# Altium integrated library ALTIUM-WR-TBL_RISING_CLAMP_SYSTEM-rev18b.IntLib: 432 symbols (part 1 of 2) (continued)
## 691244500010 (continued)

## 691244510004
designator J?
Serie 2445 - 5.08 mm Horizontal Entry Modular with Rising Cage Clamp WR-TBL, 4 pin; Part Number: 691244510004; Pin Number: 4; Pitch: 5.08 mm; ComponentLink1Description: Manufacturer; ComponentLink1URL: http://www.we-online.de; ComponentLink2Description: Datasheet; ComponentLink2URL: http://katalog.we-online.de/em/datasheet/6912445100xx.pdf; Published Date: June 2018; Publisher: Wurth Elektronik; Operating Temperature: -30 to 120 degC; Mounting Technology: THT; Packaging: Box
footprint 691244510004
pins: 1, 2, 3, 4

## 691244510005
designator J?
Serie 2445 - 5.08 mm Horizontal Entry Modular with Rising Cage Clamp WR-TBL, 5 pin; Part Number: 691244510005; Pin Number: 5; Pitch: 5.08 mm; ComponentLink1Description: Manufacturer; ComponentLink1URL: http://www.we-online.de; ComponentLink2Description: Datasheet; ComponentLink2URL: http://katalog.we-online.de/em/datasheet/6912445100xx.pdf; Published Date: June 2018; Publisher: Wurth Elektronik; Operating Temperature: -30 to 120 degC; Mounting Technology: THT; Packaging: Box
footprint 691244510005
pins: 1, 2, 3, 4, 5

## 691244510006
designator J?
Serie 2445 - 5.08 mm Horizontal Entry Modular with Rising Cage Clamp WR-TBL, 6 pin; Part Number: 691244510006; Pin Number: 6; Pitch: 5.08 mm; ComponentLink1Description: Manufacturer; ComponentLink1URL: http://www.we-online.de; ComponentLink2Description: Datasheet; ComponentLink2URL: http://katalog.we-online.de/em/datasheet/6912445100xx.pdf; Published Date: June 2018; Publisher: Wurth Elektronik; Operating Temperature: -30 to 120 degC; Mounting Technology: THT; Packaging: Box
footprint 691244510006
pins: 1, 2, 3, 4, 5, 6

## 691244510007
designator J?
Serie 2445 - 5.08 mm Horizontal Entry Modular with Rising Cage Clamp WR-TBL, 7 pin; Part Number: 691244510007; Pin Number: 7; Pitch: 5.08 mm; ComponentLink1Description: Manufacturer; ComponentLink1URL: http://www.we-online.de; ComponentLink2Description: Datasheet; ComponentLink2URL: http://katalog.we-online.de/em/datasheet/6912445100xx.pdf; Published Date: June 2018; Publisher: Wurth Elektronik; Operating Temperature: -30 to 120 degC; Mounting Technology: THT; Packaging: Box
footprint 691244510007
pins: 1, 2, 3, 4, 5, 6, 7

## 691244510008
designator J?
Serie 2445 - 5.08 mm Horizontal Entry Modular with Rising Cage Clamp WR-TBL, 8 pin; Part Number: 691244510008; Pin Number: 8; Pitch: 5.08 mm; ComponentLink1Description: Manufacturer; ComponentLink1URL: http://www.we-online.de; ComponentLink2Description: Datasheet; ComponentLink2URL: http://katalog.we-online.de/em/datasheet/6912445100xx.pdf; Published Date: June 2018; Publisher: Wurth Elektronik; Operating Temperature: -30 to 120 degC; Mounting Technology: THT; Packaging: Box
footprint 691244510008
pins: 1, 2, 3, 4, 5, 6, 7, 8

## 691244510009
designator J?
Serie 2445 - 5.08 mm Horizontal Entry Modular with Rising Cage Clamp WR-TBL, 9 pin; Part Number: 691244510009; Pin Number: 9; Pitch: 5.08 mm; ComponentLink1Description: Manufacturer; ComponentLink1URL: http://www.we-online.de; ComponentLink2Description: Datasheet; ComponentLink2URL: http://katalog.we-online.de/em/datasheet/6912445100xx.pdf; Published Date: June 2018; Publisher: Wurth Elektronik; Operating Temperature: -30 to 120 degC; Mounting Technology: THT; Packaging: Box
footprint 691244510009
pins: 1, 2, 3, 4, 5, 6, 7, 8, 9

## 691244510010
designator J?
Serie 2445 - 5.08 mm Horizontal Entry Modular with Rising Cage Clamp WR-TBL, 10 pin; Part Number: 691244510010; Pin Number: 10; Pitch: 5.08 mm; ComponentLink1Description: Manufacturer; ComponentLink1URL: http://www.we-online.de; ComponentLink2Description: Datasheet; ComponentLink2URL: http://katalog.we-online.de/em/datasheet/6912445100xx.pdf; Published Date: June 2018; Publisher: Wurth Elektronik; Operating Temperature: -30 to 120 degC; Mounting Technology: THT; Packaging: Box
footprint 691244510010
pins: 1, 2, 3, 4, 5, 6, 7, 8, 9, 10

## 691245510004
designator J?
Serie 2455 - 5.08 mm Horizontal Cable Entry with Rising Cage WR-TBL, 4 pin; Part Number: 691245510004; Pin Number: 4; Pitch: 5.08 mm; ComponentLink1Description: Manufacturer; ComponentLink1URL: http://www.we-online.de; ComponentLink2Description: Datasheet; ComponentLink2URL: http://katalog.we-online.de/em/datasheet/6912455100xx.pdf; Published Date: June 2018; Publisher: Wurth Elektronik; Operating Temperature: -30 to 120 degC; Mounting Technology: THT; Packaging: Box
footprint 691245510004
pins: 1, 2, 3, 4

## 691245510005
designator J?
Serie 2455 - 5.08 mm Horizontal Cable Entry with Rising Cage WR-TBL, 5 pin; Part Number: 691245510005; Pin Number: 5; Pitch: 5.08 mm; ComponentLink1Description: Manufacturer; ComponentLink1URL: http://www.we-online.de; ComponentLink2Description: Datasheet; ComponentLink2URL: http://katalog.we-online.de/em/datasheet/6912455100xx.pdf; Published Date: June 2018; Publisher: Wurth Elektronik; Operating Temperature: -30 to 120 degC; Mounting Technology: THT; Packaging: Box
footprint 691245510005
pins: 1, 2, 3, 4, 5

## 691245510006
designator J?
Serie 2455 - 5.08 mm Horizontal Cable Entry with Rising Cage WR-TBL, 6 pin; Part Number: 691245510006; Pin Number: 6; Pitch: 5.08 mm; ComponentLink1Description: Manufacturer; ComponentLink1URL: http://www.we-online.de; ComponentLink2Description: Datasheet; ComponentLink2URL: http://katalog.we-online.de/em/datasheet/6912455100xx.pdf; Published Date: June 2018; Publisher: Wurth Elektronik; Operating Temperature: -30 to 120 degC; Mounting Technology: THT; Packaging: Box
footprint 691245510006
pins: 1, 2, 3, 4, 5, 6

## 691245510007
designator J?
Serie 2455 - 5.08 mm Horizontal Cable Entry with Rising Cage WR-TBL, 7 pin; Part Number: 691245510007; Pin Number: 7; Pitch: 5.08 mm; ComponentLink1Description: Manufacturer; ComponentLink1URL: http://www.we-online.de; ComponentLink2Description: Datasheet; ComponentLink2URL: http://katalog.we-online.de/em/datasheet/6912455100xx.pdf; Published Date: June 2018; Publisher: Wurth Elektronik; Operating Temperature: -30 to 120 degC; Mounting Technology: THT; Packaging: Box
footprint 691245510007
pins: 1, 2, 3, 4, 5, 6, 7

## 691245510008
designator J?
Serie 2455 - 5.08 mm Horizontal Cable Entry with Rising Cage WR-TBL, 8 pin; Part Number: 691245510008; Pin Number: 8; Pitch: 5.08 mm; ComponentLink1Description: Manufacturer; ComponentLink1URL: http://www.we-online.de; ComponentLink2Description: Datasheet; ComponentLink2URL: http://katalog.we-online.de/em/datasheet/6912455100xx.pdf; Published Date: June 2018; Publisher: Wurth Elektronik; Operating Temperature: -30 to 120 degC; Mounting Technology: THT; Packaging: Box
footprint 691245510008
pins: 1, 2, 3, 4, 5, 6, 7, 8

## 691245510009
designator J?
Serie 2455 - 5.08 mm Horizontal Cable Entry with Rising Cage WR-TBL, 9 pin; Part Number: 691245510009; Pin Number: 9; Pitch: 5.08 mm; ComponentLink1Description: Manufacturer; ComponentLink1URL: http://www.we-online.de; ComponentLink2Description: Datasheet; ComponentLink2URL: http://katalog.we-online.de/em/datasheet/6912455100xx.pdf; Published Date: June 2018; Publisher: Wurth Elektronik; Operating Temperature: -30 to 120 degC; Mounting Technology: THT; Packaging: Box
footprint 691245510009
pins: 1, 2, 3, 4, 5, 6, 7, 8, 9

## 691245510010
designator J?
Serie 2455 - 5.08 mm Horizontal Cable Entry with Rising Cage WR-TBL, 10 pin; Part Number: 691245510010; Pin Number: 10; Pitch: 5.08 mm; ComponentLink1Description: Manufacturer; ComponentLink1URL: http://www.we-online.de; ComponentLink2Description: Datasheet; ComponentLink2URL: http://katalog.we-online.de/em/datasheet/6912455100xx.pdf; Published Date: June 2018; Publisher: Wurth Elektronik; Operating Temperature: -30 to 120 degC; Mounting Technology: THT; Packaging: Box
footprint 691245510010
pins: 1, 2, 3, 4, 5, 6, 7, 8, 9, 10

## 691247510006
designator J?
Serie 2475 - 5.08 mm Triple Level Horizontal Cable Entry Modular with Rising Cage Clamp WR-TBL, 6 pin; Part Number: 691247510006; Pin Number: 6; Pitch: 5.08 mm; ComponentLink1Description: Manufacturer; ComponentLink1URL: http://www.we-online.de; ComponentLink2Description: Datasheet; ComponentLink2URL: http://katalog.we-online.de/em/datasheet/691247510006.pdf; Published Date: June 2018; Publisher: Wurth Elektronik; Operating Temperature: -30 to 120 degC; Mounting Technology: THT; Packaging: Box
footprint 691247510006
pins: 1, 2, 3, 4, 5, 6

## 691247510009
designator J?
Serie 2475 - 5.08 mm Triple Level Horizontal Cable Entry Modular with Rising Cage Clamp WR-TBL, 9 pin; Part Number: 691247510009; Pin Number: 9; Pitch: 5.08 mm; ComponentLink1Description: Manufacturer; ComponentLink1URL: http://www.we-online.de; ComponentLink2Description: Datasheet; ComponentLink2URL: http://katalog.we-online.de/em/datasheet/691247510009.pdf; Published Date: June 2018; Publisher: Wurth Elektronik; Operating Temperature: -30 to 120 degC; Mounting Technology: THT; Packaging: Box
footprint 691247510009
pins: 1, 2, 3, 4, 5, 6, 7, 8, 9

## 691249510002
designator J?
Serie 2495 - 5.08 mm Horizontal Entry with Rising Cage Clamp WR-TBL, 2 pin; Part Number: 691249510002; Pin Number: 2; Pitch: 5.08 mm; ComponentLink1Description: Manufacturer; ComponentLink1URL: http://www.we-online.de; ComponentLink2Description: Datasheet; ComponentLink2URL: http://katalog.we-online.de/em/datasheet/691249510002.pdf; Published Date: June 2018; Publisher: Wurth Elektronik; Operating Temperature: -30 to 120 degC; Mounting Technology: THT; Packaging: Box
footprint 691249510002
pins: 1, 2

## 691249510003
designator J?
Serie 2495 - 5.08 mm Horizontal Entry with Rising Cage Clamp WR-TBL, 3 pin; Part Number: 691249510003; Pin Number: 3; Pitch: 5.08 mm; ComponentLink1Description: Manufacturer; ComponentLink1URL: http://www.we-online.de; ComponentLink2Description: Datasheet; ComponentLink2URL: http://katalog.we-online.de/em/datasheet/691249510003.pdf; Published Date: June 2018; Publisher: Wurth Elektronik; Operating Temperature: -30 to 120 degC; Mounting Technology: THT; Packaging: Box
footprint 691249510003
pins: 1, 2, 3

## 691253500002
designator J?
Serie 2535 - 5.08 mm Vertical Entry Modular with Rising Cage Clamp WR-TBL, 2 pin; Part Number: 691253500002; Pin Number: 2; Pitch: 5.08 mm; ComponentLink1Description: Manufacturer; ComponentLink1URL: http://www.we-online.de; ComponentLink2Description: Datasheet; ComponentLink2URL: http://katalog.we-online.de/em/datasheet/6912535000XX.pdf; Published Date: June 2018; Publisher: Wurth Elektronik; Operating Temperature: -30 to 120 degC; Mounting Technology: THT; Packaging: Box
footprint 691253500002
pins: 1, 2

## 691253500003
designator J?
Serie 2535 - 5.08 mm Vertical Entry Modular with Rising Cage Clamp WR-TBL, 3 pin; Part Number: 691253500003; Pin Number: 3; Pitch: 5.08 mm; ComponentLink1Description: Manufacturer; ComponentLink1URL: http://www.we-online.de; ComponentLink2Description: Datasheet; ComponentLink2URL: http://katalog.we-online.de/em/datasheet/6912535000XX.pdf; Published Date: June 2018; Publisher: Wurth Elektronik; Operating Temperature: -30 to 120 degC; Mounting Technology: THT; Packaging: Box
footprint 691253500003
pins: 1, 2, 3

## 691253510002
designator J?
Serie 2535 - 5.08 mm Horizontal Entry Modular with Rising Cage Clamp WR-TBL, 2 pin; Part Number: 691253510002; Pin Number: 2; Pitch: 5.08 mm; ComponentLink1Description: Manufacturer; ComponentLink1URL: http://www.we-online.de; ComponentLink2Description: Datasheet; ComponentLink2URL: http://katalog.we-online.de/em/datasheet/6912535100xx.pdf; Published Date: June 2018; Publisher: Wurth Elektronik; Operating Temperature: -30 to 120 degC; Mounting Technology: THT; Packaging: Box
footprint 691253510002
pins: 1, 2

## 691253510003
designator J?
Serie 2535 - 5.08 mm Horizontal Entry Modular with Rising Cage Clamp WR-TBL, 3 pin; Part Number: 691253510003; Pin Number: 3; Pitch: 5.08 mm; ComponentLink1Description: Manufacturer; ComponentLink1URL: http://www.we-online.de; ComponentLink2Description: Datasheet; ComponentLink2URL: http://katalog.we-online.de/em/datasheet/6912535100xx.pdf; Published Date: June 2018; Publisher: Wurth Elektronik; Operating Temperature: -30 to 120 degC; Mounting Technology: THT; Packaging: Box
footprint 691253510003
pins: 1, 2, 3

## 691254510002
designator J?
Serie 2545 - 5.08 mm Horizontal Cable Entry with Rising Cage WR-TBL, 2 pin; Part Number: 691254510002; Pin Number: 2; Pitch: 5.08 mm; ComponentLink1Description: Manufacturer; ComponentLink1URL: http://www.we-online.de; ComponentLink2Description: Datasheet; ComponentLink2URL: http://katalog.we-online.de/em/datasheet/6912545100xx.pdf; Published Date: June 2018; Publisher: Wurth Elektronik; Operating Temperature: -30 to 120 degC; Mounting Technology: THT; Packaging: Box
footprint 691254510002
pins: 1, 2

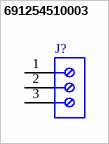
[diagram p2: symbol 691254510003]

## 691254510003
designator J?
Serie 2545 - 5.08 mm Horizontal Cable Entry with Rising Cage WR-TBL, 3 pin; Part Number: 691254510003; Pin Number: 3; Pitch: 5.08 mm; ComponentLink1Description: Manufacturer; ComponentLink1URL: http://www.we-online.de; ComponentLink2Description: Datasheet; ComponentLink2URL: http://katalog.we-online.de/em/datasheet/6912545100xx.pdf; Published Date: June 2018; Publisher: Wurth Elektronik; Operating Temperature: -30 to 120 degC; Mounting Technology: THT; Packaging: Box
footprint 691254510003
pins: 1, 2, 3


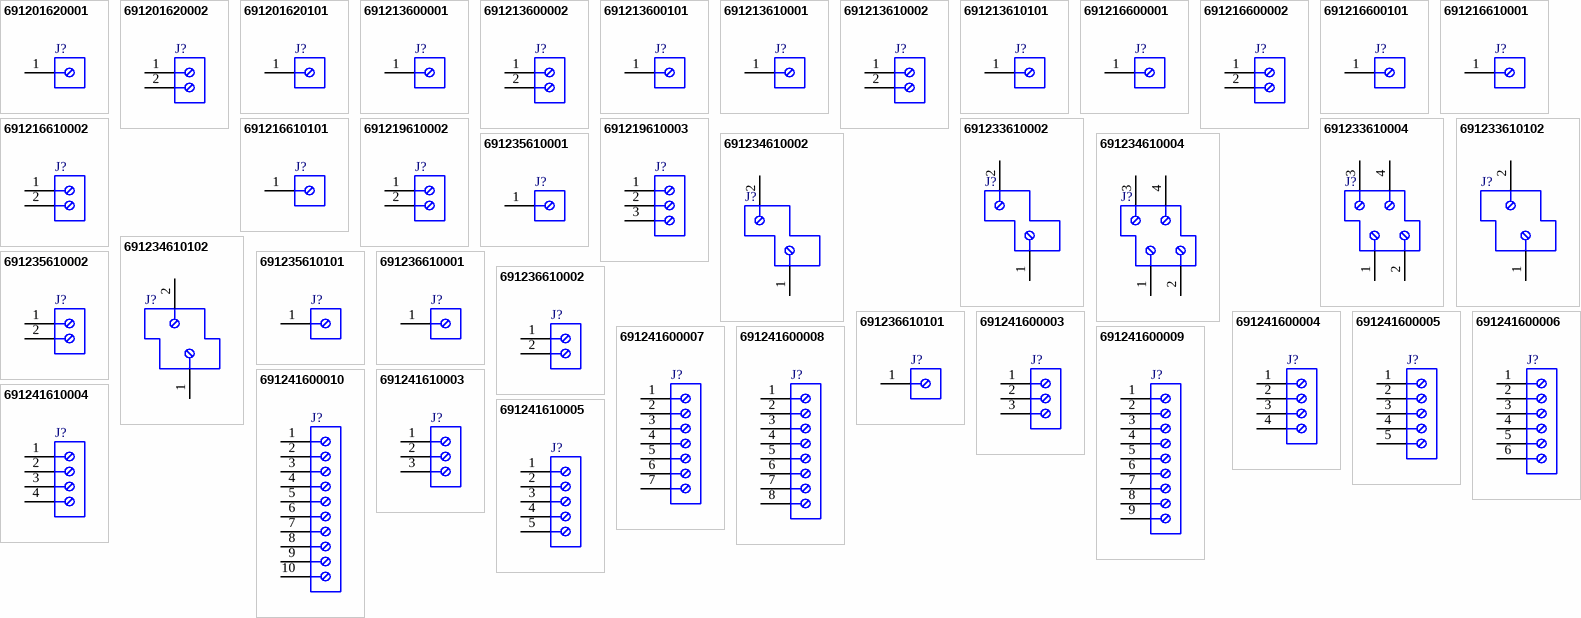
[diagram p3: symbols 691201620001 to 691241610005]

## 691201620001
designator J?
Serie 2016 - 10.16 mm 45deg Entry with Rising Cage Clamp WR-TBL, 1 pin; Part Number: 691201620001; Pin Number: 1; ComponentLink1Description: Manufacturer; ComponentLink1URL: http://www.we-online.de; ComponentLink2Description: Datasheet; ComponentLink2URL: http://katalog.we-online.de/em/datasheet/691201620001.pdf; Published Date: June 2018; Publisher: Wurth Elektronik; Pitch: 10.16 mm; Operating Temperature: -30 to 120 degC; Mounting Technology: THT; Packaging: Box
footprint 691201620001
pins: 1

## 691201620002
designator J?
Serie 2016 - 10.16 mm 45deg Entry with Rising Cage Clamp WR-TBL, 2 pin; Part Number: 691201620002; Pin Number: 2; ComponentLink1Description: Manufacturer; ComponentLink1URL: http://www.we-online.de; ComponentLink2Description: Datasheet; ComponentLink2URL: http://katalog.we-online.de/em/datasheet/691201620002.pdf; Published Date: June 2018; Publisher: Wurth Elektronik; Pitch: 10.16 mm; Operating Temperature: -30 to 120 degC; Mounting Technology: THT; Packaging: Box
footprint 691201620002
pins: 1, 2

## 691201620101
designator J?
Serie 2016 - 10.16 mm 45deg Entry with Rising Cage Clamp WR-TBL, 1 pin; Part Number: 691201620101; Pin Number: 1; ComponentLink1Description: Manufacturer; ComponentLink1URL: http://www.we-online.de; ComponentLink2Description: Datasheet; ComponentLink2URL: http://katalog.we-online.de/em/datasheet/691201620101.pdf; Published Date: June 2018; Publisher: Wurth Elektronik; Pitch: 10.16 mm; Operating Temperature: -30 to 120 degC; Mounting Technology: THT; Packaging: Box
footprint 691201620101
pins: 1

## 691213600001
designator J?
Serie 2136 - 10.16 mm Vertical Entry with Rising Cage Clamp WR-TBL, 1 pin; Part Number: 691213600001; Pin Number: 1; ComponentLink1Description: Manufacturer; ComponentLink1URL: http://www.we-online.de; ComponentLink2Description: Datasheet; ComponentLink2URL: http://katalog.we-online.de/em/datasheet/691213600001.pdf; Published Date: June 2018; Publisher: Wurth Elektronik; Pitch: 10.16 mm; Operating Temperature: -30 to 120 degC; Mounting Technology: THT; Packaging: Box
footprint 691213600001
pins: 1

## 691213600002
designator J?
Serie 2136 - 10.16 mm Vertical Entry with Rising Cage Clamp WR-TBL, 2 pin; Part Number: 691213600002; Pin Number: 2; ComponentLink1Description: Manufacturer; ComponentLink1URL: http://www.we-online.de; ComponentLink2Description: Datasheet; ComponentLink2URL: http://katalog.we-online.de/em/datasheet/691213600002.pdf; Published Date: June 2018; Publisher: Wurth Elektronik; Pitch: 10.16 mm; Operating Temperature: -30 to 120 degC; Mounting Technology: THT; Packaging: Box
footprint 691213600002
pins: 1, 2

## 691213600101
designator J?
Serie 2136 - 10.16 mm Vertical Entry with Rising Cage Clamp WR-TBL, 1 pin; Part Number: 691213600101; Pin Number: 1; ComponentLink1Description: Manufacturer; ComponentLink1URL: http://www.we-online.de; ComponentLink2Description: Datasheet; ComponentLink2URL: http://katalog.we-online.de/em/datasheet/691213600101.pdf; Published Date: June 2018; Publisher: Wurth Elektronik; Pitch: 10.16 mm; Operating Temperature: -30 to 120 degC; Mounting Technology: THT; Packaging: Box
footprint 691213600101
pins: 1

## 691213610001
designator J?
Serie 2136 - 10.16 mm Horizontal Entry with Rising Cage Clamp WR-TBL, 1 pin; Part Number: 691213610001; Pin Number: 1; ComponentLink1Description: Manufacturer; ComponentLink1URL: http://www.we-online.de; ComponentLink2Description: Datasheet; ComponentLink2URL: http://katalog.we-online.de/em/datasheet/691213610001.pdf; Published Date: June 2018; Publisher: Wurth Elektronik; Pitch: 10.16 mm; Operating Temperature: -30 to 120 degC; Mounting Technology: THT; Packaging: Box
footprint 691213610001
pins: 1

## 691213610002
designator J?
Serie 2136 - 10.16 mm Horizontal Entry with Rising Cage Clamp WR-TBL, 2 pin; Part Number: 691213610002; Pin Number: 2; ComponentLink1Description: Manufacturer; ComponentLink1URL: http://www.we-online.de; ComponentLink2Description: Datasheet; ComponentLink2URL: http://katalog.we-online.de/em/datasheet/691213610002.pdf; Published Date: June 2018; Publisher: Wurth Elektronik; Pitch: 10.16 mm; Operating Temperature: -30 to 120 degC; Mounting Technology: THT; Packaging: Box
footprint 691213610002
pins: 1, 2

## 691213610101
designator J?
Serie 2136 - 10.16 mm Horizontal Entry with Rising Cage Clamp WR-TBL, 1 pin; Part Number: 691213610101; Pin Number: 1; ComponentLink1Description: Manufacturer; ComponentLink1URL: http://www.we-online.de; ComponentLink2Description: Datasheet; ComponentLink2URL: http://katalog.we-online.de/em/datasheet/691213610101.pdf; Published Date: June 2018; Publisher: Wurth Elektronik; Pitch: 10.16 mm; Operating Temperature: -30 to 120 degC; Mounting Technology: THT; Packaging: Box
footprint 691213610101
pins: 1

## 691216600001
designator J?
Serie 2166 - 10.16 mm Vertical Entry with Rising Cage Clamp WR-TBL, 1 pin; Part Number: 691216600001; Pin Number: 1; ComponentLink1Description: Manufacturer; ComponentLink1URL: http://www.we-online.de; ComponentLink2Description: Datasheet; ComponentLink2URL: http://katalog.we-online.de/em/datasheet/691216600001.pdf; Published Date: June 2018; Publisher: Wurth Elektronik; Pitch: 10.16 mm; Operating Temperature: -30 to 120 degC; Mounting Technology: THT; Packaging: Box
footprint 691216600001
pins: 1

## 691216600002
designator J?
Serie 2166 - 10.16 mm Vertical Entry with Rising Cage Clamp WR-TBL, 2 pin; Part Number: 691216600002; Pin Number: 2; ComponentLink1Description: Manufacturer; ComponentLink1URL: http://www.we-online.de; ComponentLink2Description: Datasheet; ComponentLink2URL: http://katalog.we-online.de/em/datasheet/691216600002.pdf; Published Date: June 2018; Publisher: Wurth Elektronik; Pitch: 10.16 mm; Operating Temperature: -30 to 120 degC; Mounting Technology: THT; Packaging: Box
footprint 691216600002
pins: 1, 2

## 691216600101
designator J?
Serie 2166 - 10.16 mm Vertical Entry with Rising Cage Clamp WR-TBL, 1 pin; Part Number: 691216600101; Pin Number: 1; ComponentLink1Description: Manufacturer; ComponentLink1URL: http://www.we-online.de; ComponentLink2Description: Datasheet; ComponentLink2URL: http://katalog.we-online.de/em/datasheet/691216600101.pdf; Published Date: June 2018; Publisher: Wurth Elektronik; Pitch: 10.16 mm; Operating Temperature: -30 to 120 degC; Mounting Technology: THT; Packaging: Box
footprint 691216600101
pins: 1

## 691216610001
designator J?
Serie 2166 - 10.16 mm Horizontal Entry with Rising Cage Clamp WR-TBL, 1 pin; Part Number: 691216610001; Pin Number: 1; ComponentLink1Description: Manufacturer; ComponentLink1URL: http://www.we-online.de; ComponentLink2Description: Datasheet; ComponentLink2URL: http://katalog.we-online.de/em/datasheet/691216610001.pdf; Published Date: June 2018; Publisher: Wurth Elektronik; Pitch: 10.16 mm; Operating Temperature: -30 to 120 degC; Mounting Technology: THT; Packaging: Box
footprint 691216610001
pins: 1

## 691216610002
designator J?
Serie 2166 - 10.16 mm Horizontal Entry with Rising Cage Clamp WR-TBL, 2 pin; Part Number: 691216610002; Pin Number: 2; ComponentLink1Description: Manufacturer; ComponentLink1URL: http://www.we-online.de; ComponentLink2Description: Datasheet; ComponentLink2URL: http://katalog.we-online.de/em/datasheet/691216610002.pdf; Published Date: June 2018; Publisher: Wurth Elektronik; Pitch: 10.16 mm; Operating Temperature: -30 to 120 degC; Mounting Technology: THT; Packaging: Box
footprint 691216610002
pins: 1, 2

## 691216610101
designator J?
Serie 2166 - 10.16 mm Horizontal Entry with Rising Cage Clamp WR-TBL, 1 pin; Part Number: 691216610101; Pin Number: 1; ComponentLink1Description: Manufacturer; ComponentLink1URL: http://www.we-online.de; ComponentLink2Description: Datasheet; ComponentLink2URL: http://katalog.we-online.de/em/datasheet/691216610101.pdf; Published Date: June 2018; Publisher: Wurth Elektronik; Pitch: 10.16 mm; Operating Temperature: -30 to 120 degC; Mounting Technology: THT; Packaging: Box
footprint 691216610101
pins: 1

## 691219610002
designator J?
Serie 2196 - 10.16 mm Horizontal Entry Modular WR-TBL, 2 pin; Part Number: 691219610002; Pin Number: 2; ComponentLink1Description: Manufacturer; ComponentLink1URL: http://www.we-online.de; ComponentLink2Description: Datasheet; ComponentLink2URL: http://katalog.we-online.de/em/datasheet/6912196100xx.pdf; Published Date: June 2018; Publisher: Wurth Elektronik; Pitch: 10.16 mm; Operating Temperature: -40 to 105 degC; Mounting Technology: THT; Packaging: Box
footprint 691219610002
pins: 1, 2

## 691219610003
designator J?
Serie 2196 - 10.16 mm Horizontal Entry Modular WR-TBL, 3 pin; Part Number: 691219610003; Pin Number: 3; ComponentLink1Description: Manufacturer; ComponentLink1URL: http://www.we-online.de; ComponentLink2Description: Datasheet; ComponentLink2URL: http://katalog.we-online.de/em/datasheet/6912196100xx.pdf; Published Date: June 2018; Publisher: Wurth Elektronik; Pitch: 10.16 mm; Operating Temperature: -40 to 105 degC; Mounting Technology: THT; Packaging: Box
footprint 691219610003
pins: 1, 2, 3

## 691233610002
designator J?
Serie 2336 - 10.16 mm Horizontal Entry with Rising Cage Clamp WR-TBL, 2 pin; Part Number: 691233610002; Pin Number: 2; ComponentLink1Description: Manufacturer; ComponentLink1URL: http://www.we-online.de; ComponentLink2Description: Datasheet; ComponentLink2URL: http://katalog.we-online.de/em/datasheet/691233610002.pdf; Published Date: June 2018; Publisher: Wurth Elektronik; Pitch: 10.16 mm; Operating Temperature: -30 to 120 degC; Mounting Technology: THT; Packaging: Box
footprint 691233610002
pins: 1, 2

## 691233610004
designator J?
Serie 2336 - 10.16 mm Horizontal Entry with Rising Cage Clamp WR-TBL, 4 pin; Part Number: 691233610004; Pin Number: 4; ComponentLink1Description: Manufacturer; ComponentLink1URL: http://www.we-online.de; ComponentLink2Description: Datasheet; ComponentLink2URL: http://katalog.we-online.de/em/datasheet/691233610004.pdf; Published Date: June 2018; Publisher: Wurth Elektronik; Pitch: 10.16 mm; Operating Temperature: -30 to 120 degC; Mounting Technology: THT; Packaging: Box
footprint 691233610004
pins: 1, 2, 3, 4

## 691233610102
designator J?
Serie 2336 - 10.16 mm Horizontal Entry with Rising Cage Clamp WR-TBL, 2 pin; Part Number: 691233610102; Pin Number: 2; ComponentLink1Description: Manufacturer; ComponentLink1URL: http://www.we-online.de; ComponentLink2Description: Datasheet; ComponentLink2URL: http://katalog.we-online.de/em/datasheet/691233610102.pdf; Published Date: June 2018; Publisher: Wurth Elektronik; Pitch: 10.16 mm; Operating Temperature: -30 to 120 degC; Mounting Technology: THT; Packaging: Box
footprint 691233610102
pins: 1, 2

## 691234610002
designator J?
Serie 2346 - 10.16 mm Horizontal Entry with Rising Cage Clamp WR-TBL, 2 pin; Part Number: 691234610002; Pin Number: 2; ComponentLink1Description: Manufacturer; ComponentLink1URL: http://www.we-online.de; ComponentLink2Description: Datasheet; ComponentLink2URL: http://katalog.we-online.de/em/datasheet/691234610002.pdf; Published Date: June 2018; Publisher: Wurth Elektronik; Pitch: 10.16 mm; Operating Temperature: -30 to 120 degC; Mounting Technology: THT; Packaging: Box
footprint 691234610002
pins: 1, 2

## 691234610004
designator J?
Serie 2346 - 10.16 mm Horizontal Entry with Rising Cage Clamp WR-TBL, 4 pin; Part Number: 691234610004; Pin Number: 4; ComponentLink1Description: Manufacturer; ComponentLink1URL: http://www.we-online.de; ComponentLink2Description: Datasheet; ComponentLink2URL: http://katalog.we-online.de/em/datasheet/691234610004.pdf; Published Date: June 2018; Publisher: Wurth Elektronik; Pitch: 10.16 mm; Operating Temperature: -30 to 120 degC; Mounting Technology: THT; Packaging: Box
footprint 691234610004
pins: 1, 2, 3, 4

## 691234610102
designator J?
Serie 2346 - 10.16 mm Horizontal Entry with Rising Cage Clamp WR-TBL, 2 pin; Part Number: 691234610102; Pin Number: 2; ComponentLink1Description: Manufacturer; ComponentLink1URL: http://www.we-online.de; ComponentLink2Description: Datasheet; ComponentLink2URL: http://katalog.we-online.de/em/datasheet/691234610102.pdf; Published Date: June 2018; Publisher: Wurth Elektronik; Pitch: 10.16 mm; Operating Temperature: -30 to 120 degC; Mounting Technology: THT; Packaging: Box
footprint 691234610102
pins: 1, 2

## 691235610001
designator J?
Serie 2356 - 10.16 mm Horizontal Entry with Rising Cage Clamp WR-TBL, 1 pin; Part Number: 691235610001; Pin Number: 1; ComponentLink1Description: Manufacturer; ComponentLink1URL: http://www.we-online.de; ComponentLink2Description: Datasheet; ComponentLink2URL: http://katalog.we-online.de/em/datasheet/691235610001.pdf; Published Date: June 2018; Publisher: Wurth Elektronik; Pitch: 10.16 mm; Operating Temperature: -30 to 120 degC; Mounting Technology: THT; Packaging: Box
footprint 691235610001
pins: 1

## 691235610002
designator J?
Serie 2356 - 10.16 mm Horizontal Entry with Rising Cage Clamp WR-TBL, 2 pin; Part Number: 691235610002; Pin Number: 2; ComponentLink1Description: Manufacturer; ComponentLink1URL: http://www.we-online.de; ComponentLink2Description: Datasheet; ComponentLink2URL: http://katalog.we-online.de/em/datasheet/691235610002.pdf; Published Date: June 2018; Publisher: Wurth Elektronik; Pitch: 10.16 mm; Operating Temperature: -30 to 120 degC; Mounting Technology: THT; Packaging: Box
footprint 691235610002
pins: 1, 2

## 691235610101
designator J?
Serie 2356 - 10.16 mm Horizontal Entry with Rising Cage Clamp WR-TBL, 1 pin; Part Number: 691235610101; Pin Number: 1; ComponentLink1Description: Manufacturer; ComponentLink1URL: http://www.we-online.de; ComponentLink2Description: Datasheet; ComponentLink2URL: http://katalog.we-online.de/em/datasheet/691235610101.pdf; Published Date: June 2018; Publisher: Wurth Elektronik; Pitch: 10.16 mm; Operating Temperature: -30 to 120 degC; Mounting Technology: THT; Packaging: Box
footprint 691235610101
pins: 1

## 691236610001
designator J?
Serie 2366 - 10.16 mm Horizontal Entry with Rising Cage Clamp WR-TBL, 1 pin; Part Number: 691236610001; Pin Number: 1; ComponentLink1Description: Manufacturer; ComponentLink1URL: http://www.we-online.de; ComponentLink2Description: Datasheet; ComponentLink2URL: http://katalog.we-online.de/em/datasheet/691236610001.pdf; Published Date: June 2018; Publisher: Wurth Elektronik; Pitch: 10.16 mm; Operating Temperature: -30 to 120 degC; Mounting Technology: THT; Packaging: Box
footprint 691236610001
pins: 1

## 691236610002
designator J?
Serie 2366 - 10.16 mm Horizontal Entry with Rising Cage Clamp WR-TBL, 2 pin; Part Number: 691236610002; Pin Number: 2; ComponentLink1Description: Manufacturer; ComponentLink1URL: http://www.we-online.de; ComponentLink2Description: Datasheet; ComponentLink2URL: http://katalog.we-online.de/em/datasheet/691236610002.pdf; Published Date: June 2018; Publisher: Wurth Elektronik; Pitch: 10.16 mm; Operating Temperature: -30 to 120 degC; Mounting Technology: THT; Packaging: Box
footprint 691236610002
pins: 1, 2

## 691236610101
designator J?
Serie 2366 - 10.16 mm Horizontal Entry with Rising Cage Clamp WR-TBL, 1 pin; Part Number: 691236610101; Pin Number: 1; ComponentLink1Description: Manufacturer; ComponentLink1URL: http://www.we-online.de; ComponentLink2Description: Datasheet; ComponentLink2URL: http://katalog.we-online.de/em/datasheet/691236610101.pdf; Published Date: June 2018; Publisher: Wurth Elektronik; Pitch: 10.16 mm; Operating Temperature: -30 to 120 degC; Mounting Technology: THT; Packaging: Box
footprint 691236610101
pins: 1

## 691241600003
designator J?
Serie 2416 - 10.16 mm Vertical Entry with Rising Cage Clamp WR-TBL, 3 pin; Part Number: 691241600003; Pin Number: 3; ComponentLink1Description: Manufacturer; ComponentLink1URL: http://www.we-online.de; ComponentLink2Description: Datasheet; ComponentLink2URL: http://katalog.we-online.de/em/datasheet/691241600003.pdf; Published Date: June 2018; Publisher: Wurth Elektronik; Pitch: 10.16 mm; Operating Temperature: -30 to 120 degC; Mounting Technology: THT; Packaging: Box
footprint 691241600003
pins: 1, 2, 3

## 691241600004
designator J?
Serie 2416 - 10.16 mm Vertical Entry with Rising Cage Clamp WR-TBL, 4 pin; Part Number: 691241600004; Pin Number: 4; ComponentLink1Description: Manufacturer; ComponentLink1URL: http://www.we-online.de; ComponentLink2Description: Datasheet; ComponentLink2URL: http://katalog.we-online.de/em/datasheet/691241600004.pdf; Published Date: June 2018; Publisher: Wurth Elektronik; Pitch: 10.16 mm; Operating Temperature: -30 to 120 degC; Mounting Technology: THT; Packaging: Box
footprint 691241600004
pins: 1, 2, 3, 4

## 691241600005
designator J?
Serie 2416 - 10.16 mm Vertical Entry with Rising Cage Clamp WR-TBL, 5 pin; Part Number: 691241600005; Pin Number: 5; ComponentLink1Description: Manufacturer; ComponentLink1URL: http://www.we-online.de; ComponentLink2Description: Datasheet; ComponentLink2URL: http://katalog.we-online.de/em/datasheet/691241600005.pdf; Published Date: June 2018; Publisher: Wurth Elektronik; Pitch: 10.16 mm; Operating Temperature: -30 to 120 degC; Mounting Technology: THT; Packaging: Box
footprint 691241600005
pins: 1, 2, 3, 4, 5

## 691241600006
designator J?
Serie 2416 - 10.16 mm Vertical Entry with Rising Cage Clamp WR-TBL, 6 pin; Part Number: 691241600006; Pin Number: 6; ComponentLink1Description: Manufacturer; ComponentLink1URL: http://www.we-online.de; ComponentLink2Description: Datasheet; ComponentLink2URL: http://katalog.we-online.de/em/datasheet/691241600006.pdf; Published Date: June 2018; Publisher: Wurth Elektronik; Pitch: 10.16 mm; Operating Temperature: -30 to 120 degC; Mounting Technology: THT; Packaging: Box
footprint 691241600006
pins: 1, 2, 3, 4, 5, 6

## 691241600007
designator J?
Serie 2416 - 10.16 mm Vertical Entry with Rising Cage Clamp WR-TBL, 7 pin; Part Number: 691241600007; Pin Number: 7; ComponentLink1Description: Manufacturer; ComponentLink1URL: http://www.we-online.de; ComponentLink2Description: Datasheet; ComponentLink2URL: http://katalog.we-online.de/em/datasheet/691241600007.pdf; Published Date: June 2018; Publisher: Wurth Elektronik; Pitch: 10.16 mm; Operating Temperature: -30 to 120 degC; Mounting Technology: THT; Packaging: Box
footprint 691241600007
pins: 1, 2, 3, 4, 5, 6, 7

## 691241600008
designator J?
Serie 2416 - 10.16 mm Vertical Entry with Rising Cage Clamp WR-TBL, 8 pin; Part Number: 691241600008; Pin Number: 8; ComponentLink1Description: Manufacturer; ComponentLink1URL: http://www.we-online.de; ComponentLink2Description: Datasheet; ComponentLink2URL: http://katalog.we-online.de/em/datasheet/691241600008.pdf; Published Date: June 2018; Publisher: Wurth Elektronik; Pitch: 10.16 mm; Operating Temperature: -30 to 120 degC; Mounting Technology: THT; Packaging: Box
footprint 691241600008
pins: 1, 2, 3, 4, 5, 6, 7, 8

## 691241600009
designator J?
Serie 2416 - 10.16 mm Vertical Entry with Rising Cage Clamp WR-TBL, 9 pin; Part Number: 691241600009; Pin Number: 9; ComponentLink1Description: Manufacturer; ComponentLink1URL: http://www.we-online.de; ComponentLink2Description: Datasheet; ComponentLink2URL: http://katalog.we-online.de/em/datasheet/691241600009.pdf; Published Date: June 2018; Publisher: Wurth Elektronik; Pitch: 10.16 mm; Operating Temperature: -30 to 120 degC; Mounting Technology: THT; Packaging: Box
footprint 691241600009
pins: 1, 2, 3, 4, 5, 6, 7, 8, 9

## 691241600010
designator J?
Serie 2416 - 10.16 mm Vertical Entry with Rising Cage Clamp WR-TBL, 10 pin; Part Number: 691241600010; Pin Number: 10; ComponentLink1Description: Manufacturer; ComponentLink1URL: http://www.we-online.de; ComponentLink2Description: Datasheet; ComponentLink2URL: http://katalog.we-online.de/em/datasheet/691241600010.pdf; Published Date: June 2018; Publisher: Wurth Elektronik; Pitch: 10.16 mm; Operating Temperature: -30 to 120 degC; Mounting Technology: THT; Packaging: Box
footprint 691241600010
pins: 1, 2, 3, 4, 5, 6, 7, 8, 9, 10

## 691241610003
designator J?
Serie 2416 - 10.16 mm Horizontal Entry with Rising Cage Clamp WR-TBL, 3 pin; Part Number: 691241610003; Pin Number: 3; ComponentLink1Description: Manufacturer; ComponentLink1URL: http://www.we-online.de; ComponentLink2Description: Datasheet; ComponentLink2URL: http://katalog.we-online.de/em/datasheet/691241610003.pdf; Published Date: June 2018; Publisher: Wurth Elektronik; Pitch: 10.16 mm; Operating Temperature: -30 to 120 degC; Mounting Technology: THT; Packaging: Box
footprint 691241610003
pins: 1, 2, 3

## 691241610004
designator J?
Serie 2416 - 10.16 mm Horizontal Entry with Rising Cage Clamp WR-TBL, 4 pin; Part Number: 691241610004; Pin Number: 4; ComponentLink1Description: Manufacturer; ComponentLink1URL: http://www.we-online.de; ComponentLink2Description: Datasheet; ComponentLink2URL: http://katalog.we-online.de/em/datasheet/691241610004.pdf; Published Date: June 2018; Publisher: Wurth Elektronik; Pitch: 10.16 mm; Operating Temperature: -30 to 120 degC; Mounting Technology: THT; Packaging: Box
footprint 691241610004
pins: 1, 2, 3, 4

## 691241610005
designator J?
Serie 2416 - 10.16 mm Horizontal Entry with Rising Cage Clamp WR-TBL, 5 pin; Part Number: 691241610005; Pin Number: 5; ComponentLink1Description: Manufacturer; ComponentLink1URL: http://www.we-online.de; ComponentLink2Description: Datasheet; ComponentLink2URL: http://katalog.we-online.de/em/datasheet/691241610005.pdf; Published Date: June 2018; Publisher: Wurth Elektronik; Pitch: 10.16 mm; Operating Temperature: -30 to 120 degC; Mounting Technology: THT; Packaging: Box
footprint 691241610005
pins: 1, 2, 3, 4, 5
